# Altium footprint library 自建库.PcbLib: 169 footprints (part 1 of 11)
Each footprint in its own frame and in the unit in brackets; x right, y up, seen from the top. Pads: shape width x height; smd on the part's side, far side on the other; paste and mask are expansions set on the pad; w line width, h text height; cw(c..) or ccw(c..) is an arc to the next point about the centre after c.
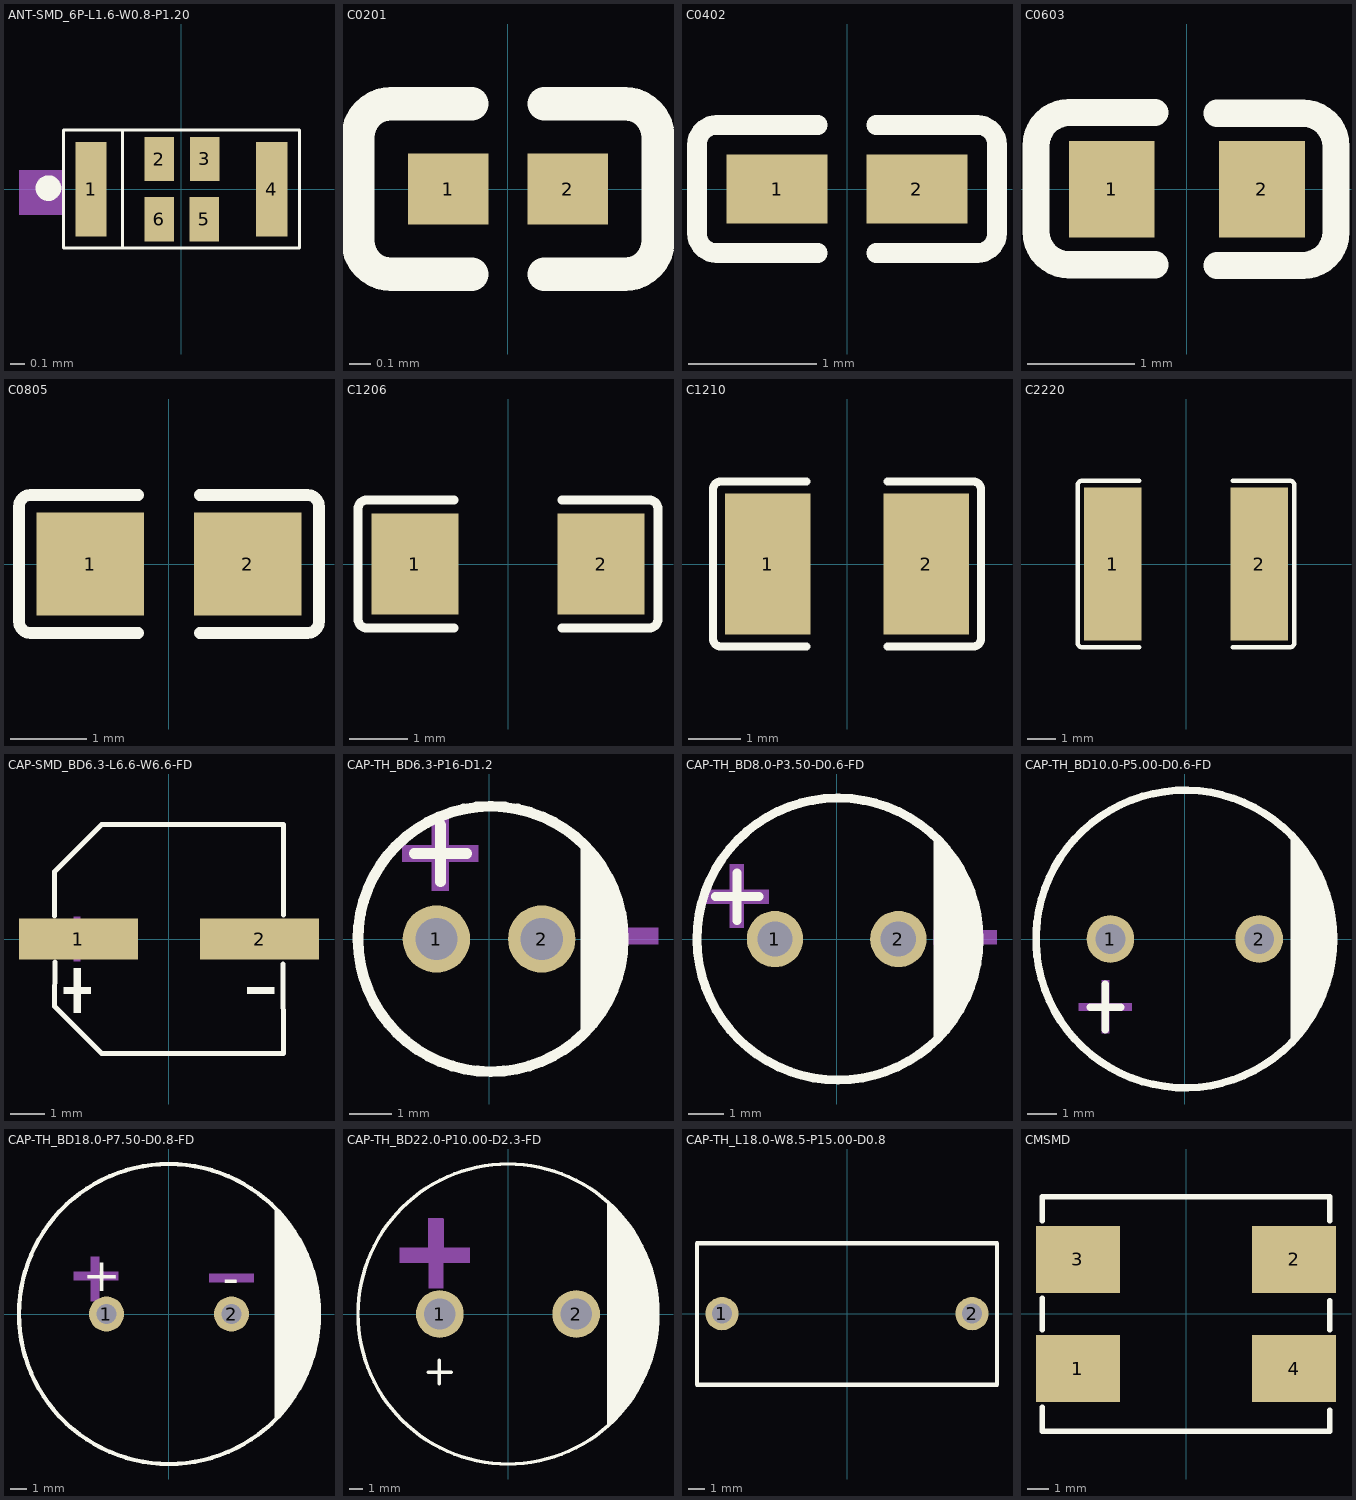
[diagram p0: the footprints below, top view; thin cyan lines are the x and y axes]

## ANT-SMD_6P-L1.6-W0.8-P1.20 [mm]
pads (6):
  rect 0.21x0.64 smd: 1(-0.612,0) 4(0.612,0)
  rect 0.2x0.3 smd: 2(-0.151,0.203) 3(0.158,0.204) 5(0.154,-0.204) 6(-0.151,-0.204)
Top Overlay:
  circle w0.102: c-0.901,0.007 r0.036
  lines w0.02: -0.399,-0.4 -0.399,0.401 ; -0.799,-0.4 -0.799,0.401 0.801,0.401 0.801,-0.4 -0.799,-0.4
Top Paste:
  region: -0.251,0.153 -0.251,0.353 -0.114,0.353 -0.114,0.153
  region: -0.112,-0.154 -0.112,-0.354 -0.249,-0.354 -0.249,-0.154
  region: 0.254,-0.154 0.254,-0.354 0.118,-0.354 0.118,-0.154
  region: 0.716,0.32 0.716,-0.32 0.507,-0.32 0.507,0.32
  region: 0.258,0.354 0.258,0.154 0.118,0.154 0.118,0.354
  region: -0.507,0.32 -0.507,-0.32 -0.716,-0.32 -0.716,0.32
Mechanical 15:
  region: -1.1,0.127 -1.1,-0.173 -0.81,-0.173 -0.81,0.127
3D body "Ant_ANT016008LCS2442MA2_SMT_ANT.STEP": height 0.4, standoff 0, extent -0.8,-0.4 0.8,0.4

## C0201 [mm] "0603"
pads (2):
  rect 0.368x0.324 smd: 1(-0.274,0) 2(0.274,0)
Top Overlay:
  lines w0.152: -0.166,-0.391 -0.535,-0.391 cw(c-0.535,-0.238) -0.687,-0.238 -0.687,0.238 cw(c-0.535,0.238) -0.535,0.391 -0.166,0.391 ; 0.166,-0.391 0.535,-0.391 ccw(c0.535,-0.238) 0.687,-0.238 0.687,0.238 ccw(c0.535,0.238) 0.535,0.391 0.166,0.391
Top Paste:
  region: 0.081,-0.138 0.081,0.138 0.105,0.162 0.434,0.162 0.458,0.138 0.458,-0.138 0.434,-0.162 0.105,-0.162
  region: -0.081,-0.138 -0.081,0.138 -0.105,0.162 -0.434,0.162 -0.458,0.138 -0.458,-0.138 -0.434,-0.162 -0.105,-0.162
3D body "CAP0201.STEP": height 0.3, standoff 0, extent -0.298,-0.146 0.302,0.154

## C0402 [mm] "1005"
pads (2):
  rect 0.79x0.54 smd: 1(-0.545,0) 2(0.545,0)
Top Overlay:
  lines w0.152: -0.226,-0.499 -1.016,-0.499 cw(c-1.016,-0.346) -1.169,-0.346 -1.169,0.346 cw(c-1.016,0.346) -1.016,0.499 -0.226,0.499 ; 0.226,-0.499 1.016,-0.499 ccw(c1.016,-0.346) 1.169,-0.346 1.169,0.346 ccw(c1.016,0.346) 1.016,0.499 0.226,0.499
Top Paste:
  region: 0.78,0.225 0.78,-0.225 0.73,-0.275 0.25,-0.275 0.18,-0.225 0.18,0.225 0.25,0.275 0.73,0.275
  region: -0.18,0.225 -0.18,-0.225 -0.25,-0.275 -0.73,-0.275 -0.78,-0.225 -0.78,0.225 -0.73,0.275 -0.25,0.275
3D body "CAP0402-1.STEP": height 0.5, standoff 0, extent -0.5,-0.25 0.5,0.25

## C0603 [mm] "1608"
pads (2):
  rect 0.8x0.9 smd: 1(-0.7,0) 2(0.7,0)
Top Overlay:
  lines w0.254: -0.296,-0.704 -1.096,-0.704 cw(c-1.096,-0.394) -1.406,-0.394 -1.405,0.406 cw(c-1.096,0.406) -1.096,0.715 -0.296,0.715 ; 0.28,-0.71 1.08,-0.71 ccw(c1.08,-0.4) 1.39,-0.4 1.39,0.4 ccw(c1.08,0.4) 1.08,0.71 0.28,0.71
3D body "CAP0603-2.STEP": height 0.8, standoff 0, extent -0.8,-0.4 0.8,0.4

## C0805 [mm] "2012"
pads (2):
  rect 1.41x1.35 smd: 1(-1.03,0) 2(1.03,0)
Top Overlay:
  lines w0.152: -0.401,-0.904 -1.811,-0.904 cw(c-1.811,-0.751) -1.964,-0.751 -1.964,0.751 cw(c-1.811,0.751) -1.811,0.904 -0.401,0.904 ; 0.401,-0.904 1.811,-0.904 ccw(c1.811,-0.751) 1.964,-0.751 1.964,0.751 ccw(c1.811,0.751) 1.811,0.904 0.401,0.904
Top Paste:
  region: -1.675,-0.62 -1.675,0.66 -1.625,0.71 -0.475,0.71 -0.425,0.66 -0.42,0.25 -0.87,0.25 -0.87,-0.2 -0.43,-0.2 -0.425,-0.62 -0.475,-0.67 -1.625,-0.67
  region: 0.475,-0.62 0.475,-0.2 0.92,-0.2 0.92,0.25 0.48,0.25 0.475,0.66 0.525,0.71 1.675,0.71 1.725,0.66 1.725,-0.62 1.675,-0.67 0.525,-0.67
3D body "CAP0805-1.STEP": height 1.25, standoff 0, extent -1,-0.625 1,0.625

## C1206 [mm] "3216"
pads (2):
  rect 1.485x1.728 smd: 1(-1.593,0) 2(1.593,0)
Top Overlay:
  lines w0.152: -0.926,-1.093 -2.411,-1.093 cw(c-2.411,-0.94) -2.564,-0.94 -2.564,0.94 cw(c-2.411,0.94) -2.411,1.093 -0.926,1.093 ; 0.926,-1.093 2.411,-1.093 ccw(c2.411,-0.94) 2.564,-0.94 2.564,0.94 ccw(c2.411,0.94) 2.411,1.093 0.926,1.093
Top Paste:
  region: 0.85,-0.764 0.85,-0.394 0.95,-0.294 1.255,-0.294 1.355,-0.194 1.355,0.194 1.255,0.294 0.95,0.294 0.85,0.394 0.85,0.764 0.95,0.864 2.235,0.864 2.335,0.764 2.335,-0.764 2.235,-0.864 0.95,-0.864
  region: -0.85,-0.764 -0.85,-0.394 -0.95,-0.294 -1.255,-0.294 -1.355,-0.194 -1.355,0.194 -1.255,0.294 -0.95,0.294 -0.85,0.394 -0.85,0.764 -0.95,0.864 -2.235,0.864 -2.335,0.764 -2.335,-0.764 -2.235,-0.864 -0.95,-0.864
3D body "CAP1206.STEP": height 0.87, standoff -0.87, extent -1.6,-0.85 1.6,0.85

## C1210 [mm] "3225"
pads (2):
  rect 1.635x2.7 smd paste-100 mask+0.051: 1(-1.517,0) 2(1.517,0)
Top Overlay:
  lines w0.152: -0.776,-1.579 -2.411,-1.579 cw(c-2.411,-1.426) -2.564,-1.426 -2.564,1.426 cw(c-2.411,1.426) -2.411,1.579 -0.776,1.579 ; 0.776,-1.579 2.411,-1.579 ccw(c2.411,-1.426) 2.564,-1.426 2.564,1.426 ccw(c2.411,1.426) 2.411,1.579 0.776,1.579
Top Paste:
  region: 0.7,-1.25 0.7,-0.559 0.8,-0.459 1.156,-0.459 1.256,-0.359 1.256,0.359 1.156,0.459 0.8,0.459 0.7,0.559 0.7,1.25 0.8,1.35 2.235,1.35 2.335,1.25 2.335,-1.25 2.235,-1.35 0.8,-1.35
  region: -0.7,-1.25 -0.7,-0.559 -0.8,-0.459 -1.156,-0.459 -1.256,-0.359 -1.256,0.359 -1.156,0.459 -0.8,0.459 -0.7,0.559 -0.7,1.25 -0.8,1.35 -2.235,1.35 -2.335,1.25 -2.335,-1.25 -2.235,-1.35 -0.8,-1.35
3D body "C1210.stp": height 0.92, standoff 0.02, extent -1.6,-1.26 1.6,1.26

## C2220 [mm] "5750"
pads (2):
  rect 2.01x5.4 smd paste-100 mask+0.051: 1(-2.58,0) 2(2.58,0)
Top Overlay:
  lines w0.152: -1.651,-2.929 -3.661,-2.929 cw(c-3.661,-2.776) -3.814,-2.776 -3.814,2.776 cw(c-3.661,2.776) -3.661,2.929 -1.651,2.929 ; 1.651,-2.929 3.661,-2.929 ccw(c3.661,-2.776) 3.814,-2.776 3.814,2.776 ccw(c3.661,2.776) 3.661,2.929 1.651,2.929
Top Paste:
  region: 1.575,-2.6 1.575,-1.018 1.675,-0.918 2.158,-0.918 2.258,-0.818 2.258,0.818 2.158,0.918 1.675,0.918 1.575,1.018 1.575,2.6 1.675,2.7 3.485,2.7 3.585,2.6 3.585,-2.6 3.485,-2.7 1.675,-2.7
  region: -1.575,-2.6 -1.575,-1.018 -1.675,-0.918 -2.158,-0.918 -2.258,-0.818 -2.258,0.818 -2.158,0.918 -1.675,0.918 -1.575,1.018 -1.575,2.6 -1.675,2.7 -3.485,2.7 -3.585,2.6 -3.585,-2.6 -3.485,-2.7 -1.675,-2.7
3D body "c2220.stp": height 3, standoff 0, extent -2.8,-2.5 2.8,2.5

## CAP-SMD_BD6.3-L6.6-W6.6-FD [mm]
pads (2):
  rect 3.5x1.2 smd paste+0 mask+0.051: 1(-2.67,0) 2(2.67,0)
Top Overlay:
  region: -2.805,-0.858 -2.805,-2.178 -2.607,-2.178 -2.607,-0.858
  region: -3.102,-1.419 -3.102,-1.617 -2.31,-1.617 -2.31,-1.419
  region: 3.102,-1.419 3.102,-1.617 2.31,-1.617 2.31,-1.419
  lines w0.152: -3.376,0.686 -3.376,1.98 -1.98,3.376 3.376,3.376 3.369,0.708 ; -3.362,-0.686 -3.376,-1.981 -1.981,-3.376 3.376,-3.376 3.356,-0.739
Mechanical 15:
  region: -2.81,0.66 -2.81,-0.66 -2.612,-0.66 -2.612,0.66
  region: -3.102,0.099 -3.102,-0.099 -2.31,-0.099 -2.31,0.099
  region: 3.102,0.099 3.102,-0.099 2.31,-0.099 2.31,0.099
3D body "C111600.stp": height 7.75, standoff 0, extent -3.9,-3.301 3.9,3.3

## CAP-TH_BD6.3-P16-D1.2 [mm] "06A6,560u"
pads (2):
  round 1.6 hole 1: 1(-1.25,0) 2(1.25,0)
Top Overlay:
  region: 2.178,-2.416 2.424,-2.17 2.667,-1.778 2.979,-1.308 3.117,-0.773 3.187,-0.225 3.187,0.328 3.117,0.876 3.048,1.144 2.286,2.286 2.178,2.394
  lines w0.254: -1.778,2.032 -0.533,2.032 ; -1.156,1.359 -1.156,2.705 ; 0.01,3.151 ccw(c0.038,0.001) 0.066,3.151
Mechanical 15:
  region: 3.61,0.273 2.21,0.273 2.21,-0.127 3.81,-0.127 4.01,-0.127 4.01,0.273
  region: -0.662,2.23 -2.062,2.23 -2.062,1.83 -0.462,1.83 -0.262,1.83 -0.262,2.23
  region: -1.362,2.549 -1.362,1.149 -0.962,1.149 -0.962,2.749 -0.962,2.949 -1.362,2.949
3D body "C516114.stp": height 11.11, standoff -3.5, extent -3.155,-3.149 3.155,3.151

## CAP-TH_BD8.0-P3.50-D0.6-FD [mm]
pads (2):
  round 1.6 hole 1: 1(-1.75,0) 2(1.75,0)
Top Overlay:
  region: 2.75,-3 2.941,-2.8 3.268,-2.355 3.536,-1.872 3.741,-1.359 3.88,-0.824 3.95,-0.276 3.95,0.276 3.88,0.824 3.741,1.359 3.536,1.872 3.268,2.355 2.941,2.8 2.75,3
  lines w0.254: -3.445,1.2 -2.2,1.2 ; -2.822,0.527 -2.822,1.873 ; 0.003,4 ccw(c0.038,0.001) 0.074,4
Mechanical 15:
  region: 4.148,0.255 2.748,0.255 2.748,-0.145 4.348,-0.145 4.548,-0.145 4.548,0.255
  region: -2.329,1.398 -3.729,1.398 -3.729,0.998 -2.129,0.998 -1.929,0.998 -1.929,1.398
  region: -3.029,1.717 -3.029,0.317 -2.629,0.317 -2.629,1.917 -2.629,2.117 -3.029,2.117
3D body "8-9.stp": height 9, standoff -2, extent -3.962,-3.999 4.038,4.001

## CAP-TH_BD10.0-P5.00-D0.6-FD [mm]
pads (2):
  round 1.6 hole 1 paste+0 mask+0.05: 1(-2.5,0) 2(2.5,0)
Top Overlay:
  circle w0.254: c0,0 r5
  region: 3.556,3.556 3.556,-3.556 4.318,-2.54 4.826,-1.016 5.08,0.508 4.826,1.524
  lines w0.254: -3.175,-2.286 -2.159,-2.286 ; -2.667,-3.048 -2.667,-1.524
Mechanical 15:
  region: -3.558,-2.152 -1.78,-2.152 -1.78,-2.406 -3.558,-2.406
  region: -2.796,-1.898 -2.796,-3.168 -2.542,-3.168 -2.542,-1.39 -2.796,-1.39
3D body "10-9.stp": height 9, standoff -2, extent -5,-5 5,5

## CAP-TH_BD18.0-P7.50-D0.8-FD [mm]
pads (2):
  round 2.1 hole 1.2 paste+0 mask+0.05: 1(-3.75,0) 2(3.75,0)
Top Overlay:
  circle w0.254: c0,0 r9
  region: 6.35,-6.365 6.349,6.364 6.35,6.363 6.663,6.05 7.224,5.367 7.715,4.631 8.132,3.852 8.47,3.035 8.727,2.188 8.899,1.321 8.986,0.441 8.986,-0.001 8.986,-0.443 8.899,-1.323 8.727,-2.19 8.47,-3.037 8.132,-3.854 7.715,-4.633 7.224,-5.369 6.663,-6.052 6.35,-6.365
  text "+" at -5.161,1.364 h2
  text "-" at 3.221,1.205 h2
Mechanical 15:
  region: -5.715,2.54 -3.048,2.54 -3.048,2.032 -5.715,2.032 -5.715,2.159
  region: -4.699,0.762 -4.699,3.429 -4.191,3.429 -4.191,0.762 -4.318,0.762
  region: 2.413,2.413 5.08,2.413 5.08,1.905 2.413,1.905 2.413,2.032
3D body "cap.stp": height 30.01, standoff -3.5, extent -9.005,-9 9.005,9

## CAP-TH_BD22.0-P10.00-D2.3-FD [mm]
pads (2):
  round 3.5 hole 2.3 paste+0 mask+0.051: 1(-5,0) 2(5,0)
Top Overlay:
  circle w0.254: c0,0 r11
  region: 7.28,8.16 7.28,-8.18 7.754,-7.706 8.006,-7.454 8.478,-6.916 8.912,-6.35 9.309,-5.756 9.667,-5.137 9.983,-4.496 10.256,-3.836 10.486,-3.159 10.671,-2.469 10.81,-1.769 10.903,-1.06 10.95,-0.347 10.95,0.01 10.95,0.361 10.904,1.061 10.812,1.757 10.676,2.445 10.494,3.123 10.268,3.788 10,4.436 9.689,5.066 9.338,5.673 8.949,6.257 8.521,6.814 8.059,7.341 7.81,7.59 7.39,8.01
  lines w0.254: -5.842,-4.267 -4.166,-4.267 ; -5.055,-5.105 -5.055,-3.378
Mechanical 15:
  region: -5.808,1.895 -4.758,1.895 -4.733,1.895 -4.727,6.965 -4.733,7.005 -4.738,7.005 -5.797,7.005 -5.833,7.005
  region: -2.82,3.77 -2.82,4.82 -2.82,4.845 -7.89,4.85 -7.93,4.845 -7.93,4.84 -7.93,3.78 -7.93,3.745
3D body "cap.stp": height 50.01, standoff -3.5, extent -10.996,-11 11.014,10.996

## CAP-TH_L18.0-W8.5-P15.00-D0.8 [mm] "安规电容"
pads (2):
  round 2 hole 1.2 paste+0 mask+0.051: 1(-7.5,0) 2(7.5,0)
Top Overlay:
  lines w0.254: -9,-4.27 -9,4.23 9,4.23 9,-4.27 -9,-4.27
3D body "x2.stp": height 14.5, standoff -3.5, extent -9,-4.25 9,4.251

## CMSMD [mm] "744237701焊盘"
pads (4):
  rect 4x3.2 smd: 1(-5.15,-2.6) 2(5.15,2.6) 3(-5.15,2.6) 4(5.15,-2.6)
Top Overlay:
  lines w0.254: -6.858,-4.445 -6.858,-5.588 6.858,-5.588 6.858,-4.572 ; -6.858,-0.762 -6.858,0.762 ; -6.858,4.445 -6.858,5.588 6.858,5.588 6.858,4.445 ; 6.858,-0.762 6.858,0.635
3D body "C250214.stp": height 6.3, standoff 0.3, extent -6,-5.51 6,5.5